# Altium footprint library th.PcbLib: 51 footprints (part 2 of 4)
Each footprint in its own frame and in the unit in brackets; x right, y up, seen from the top. Pads: shape width x height; smd on the part's side, far side on the other; paste and mask are expansions set on the pad; w line width, h text height; cw(c..) or ccw(c..) is an arc to the next point about the centre after c.
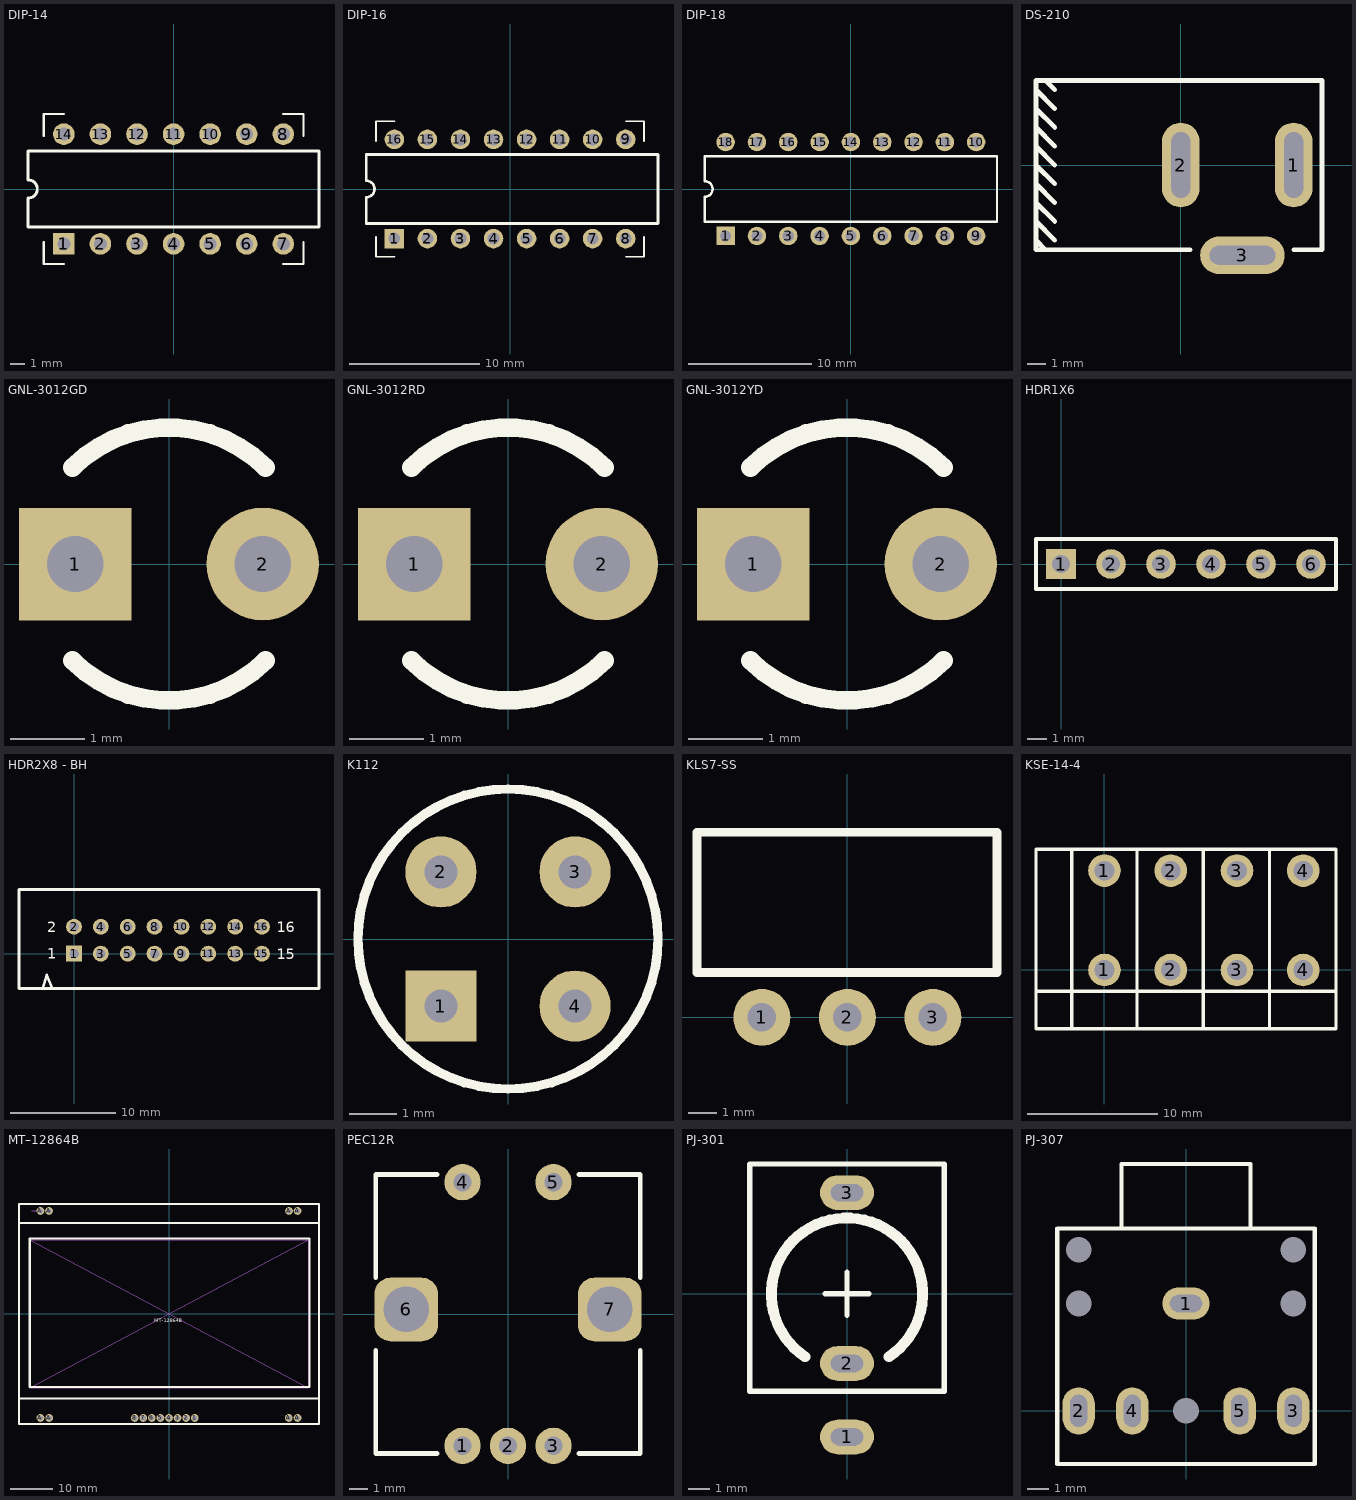
[diagram p1: the footprints below, top view; thin cyan lines are the x and y axes]

## DIP-14 [mm]
pads (14):
  rect 1.5x1.5 hole 0.9: 1(-7.62,-3.81)
  round 1.5 hole 0.9: 2(-5.08,-3.81) 3(-2.54,-3.81) 4(0,-3.81) 5(2.54,-3.81) 6(5.08,-3.81) 7(7.62,-3.81) 8(7.62,3.81) 9(5.08,3.81) 10(2.54,3.81) 11(0,3.81) 12(-2.54,3.81) 13(-5.08,3.81) 14(-7.62,3.81)
Top Overlay:
  lines w0.15: -9.017,-3.683 -9.017,-5.207 -7.62,-5.207 ; -9.017,3.683 -9.017,5.207 -7.62,5.207 ; 7.62,-5.207 9.017,-5.207 9.017,-3.683 ; 7.62,5.207 9.017,5.207 9.017,3.683
  lines w0.2: -10.1,-2.65 -10.1,-0.635 ccw(c-10.1,0) -10.1,0.635 -10.1,2.65 10.1,2.65 10.1,-2.65 -10.1,-2.65
3D body "DIP14SOC.STEP": height 5.1, standoff -2.9, extent -8.89,-5.08 8.89,5.08
3D body "SW3DPS-DIP-14-DEFAULT.STEP": height 7.51, standoff 0.53, extent -9.525,-4 9.525,4

## DIP-16 [mm]
pads (16):
  rect 1.5x1.5 hole 0.9: 1(-8.89,-3.81)
  round 1.5 hole 0.9: 2(-6.35,-3.81) 3(-3.81,-3.81) 4(-1.27,-3.81) 5(1.27,-3.81) 6(3.81,-3.81) 7(6.35,-3.81) 8(8.89,-3.81) 9(8.89,3.81) 10(6.35,3.81) 11(3.81,3.81) 12(1.27,3.81) 13(-1.27,3.81) 14(-3.81,3.81) 15(-6.35,3.81) 16(-8.89,3.81)
Top Overlay:
  lines w0.15: -10.287,-3.683 -10.287,-5.207 -8.89,-5.207 ; -10.287,3.683 -10.287,5.207 -8.89,5.207 ; 8.89,-5.207 10.287,-5.207 10.287,-3.683 ; 8.89,5.207 10.287,5.207 10.287,3.683
  lines w0.2: -11.05,2.65 -11.05,0.635 cw(c-11.05,0) -11.05,-0.635 -11.05,-2.65 11.35,-2.65 ; -11.025,2.65 11.35,2.65 ; 11.37,-2.65 11.37,2.65
3D body "SW3dPS-DIP16-300.STEP": height 8.58, standoff 1.01, extent -10,-3.935 10,3.935
3D body "User Library-16pin 0_3inch 2_54mm IC DIP Gold Socket.step": height 5.01, standoff -2.99, extent -10.16,-5 10.16,5.16

## DIP-18 [mm]
pads (18):
  rect 1.5x1.5 hole 0.9: 1(-10.16,-3.81)
  round 1.5 hole 0.9: 2(-7.62,-3.81) 3(-5.08,-3.81) 4(-2.54,-3.81) 5(0,-3.81) 6(2.54,-3.81) 7(5.08,-3.81) 8(7.62,-3.81) 9(10.16,-3.81) 10(10.16,3.81) 11(7.62,3.81) 12(5.08,3.81) 13(2.54,3.81) 14(0,3.81) 15(-2.54,3.81) 16(-5.08,3.81) 17(-7.62,3.81) 18(-10.16,3.81)
Top Overlay:
  lines w0.2: -11.85,-2.65 -11.85,-0.635 ccw(c-11.85,0) -11.85,0.635 -11.85,2.65 11.85,2.65 11.85,-2.65 -11.85,-2.65

## DS-210 [mm]
pads (3):
  oval 2x4.5 hole 3.5 slot 1 at 0 deg: 1(6,0) 2(0,0)
  oval 4.5x2 hole 3.5 slot 1 at 90 deg: 3(3.275,-4.8)
Top Overlay:
  lines w0.254: -7.7,-4 -7.2,-4.5 ; -7.7,-3 -6.7,-4 ; -7.7,-2 -6.7,-3 ; -7.7,-1 -6.7,-2 ; -7.7,0 -6.7,-1 ; -7.7,1 -6.7,0 ; -7.7,2 -6.7,1 ; -7.7,3 -6.7,2 ; -7.7,4 -6.7,3 ; -7.2,4.5 -6.7,4 ; 0.5,-4.5 -7.7,-4.5 -7.7,4.5 7.5,4.5 7.5,-4.5 6,-4.5
3D body "User Library-ds-210.STEP": height 11, standoff -4.4, extent -7.75,-5.05 6.75,4.5

## GNL-3012GD [mil]
pads (2):
  rect 60x60 hole 30: 1(-50,0)
  round 60 hole 30: 2(50,0)
Top Overlay:
  lines w10: -51.5,-51.5 ccw(c0,0) 51.5,-51.5 ; -51.5,51.5 cw(c0,0) 51.5,51.5
3D body "greengnl3.STEP": height 495.67, standoff -153.94, extent -59.84,-76.77 76.77,76.77

## GNL-3012RD [mil]
pads (2):
  rect 60x60 hole 30: 1(-50,0)
  round 60 hole 30: 2(50,0)
Top Overlay:
  lines w10: -51.5,-51.5 ccw(c0,0) 51.5,-51.5 ; -51.5,51.5 cw(c0,0) 51.5,51.5
3D body "redgnl3.STEP": height 495.67, standoff -153.94, extent -59.84,-76.77 76.77,76.77

## GNL-3012YD [mil]
pads (2):
  rect 60x60 hole 30: 1(-50,0)
  round 60 hole 30: 2(50,0)
Top Overlay:
  lines w10: -51.5,-51.5 ccw(c0,0) 51.5,-51.5 ; -51.5,51.5 cw(c0,0) 51.5,51.5
3D body "yelgnl3.STEP": height 495.67, standoff -153.94, extent -59.84,-76.77 76.77,76.77

## HDR1X6 [mm] "Connector; Header; 6 Position"
pads (6):
  rect 1.5x1.5 hole 0.9: 1(0,0)
  round 1.5 hole 0.9: 2(2.54,0) 3(5.08,0) 4(7.62,0) 5(10.16,0) 6(12.7,0)
Top Overlay:
  lines w0.2: -1.27,-1.27 13.97,-1.27 13.97,1.27 -1.27,1.27 -1.27,-1.27
3D body "pin_header_aw140-eg-g06d.stp": height 8.2, standoff -3, extent -1.17,-1.246 14.07,1.253

## HDR2X8 - BH [mm] "Connector; Header; 8x2 Position"
pads (16):
  rect 1.5x1.5 hole 0.9: 1(0,0)
  round 1.5 hole 0.9: 2(0,2.54) 3(2.54,0) 4(2.54,2.54) 5(5.08,0) 6(5.08,2.54) 7(7.62,0) 8(7.62,2.54) 9(10.16,0) 10(10.16,2.54) 11(12.7,0) 12(12.7,2.54) 13(15.24,0) 14(15.24,2.54) 15(17.78,0) 16(17.78,2.54)
Top Overlay:
  lines w0.25: -2.966,-3.297 -2.585,-2.027 -2.077,-3.297
  lines w0.254: -5.207,-3.302 -5.207,6.068 23.175,6.068 23.175,-3.302 -5.207,-3.302
  text "16" at 19.184,2.007 h1
  text "15" at 19.184,-0.533 h1
  text "1" at -2.54,-0.508 h1
  text "2" at -2.54,2.032 h1
3D body "User Library-BH-10__64.STEP": height 9.11, standoff -2.99, extent -5.11,-3.225 23.01,6.075

## K112 [mm]
pads (4):
  rect 1.5x1.5 hole 0.7: 1(-1.414,-1.414)
  round 1.5 hole 0.7: 2(-1.414,1.414) 3(1.414,1.414) 4(1.414,-1.414)
Top Overlay:
  circle w0.2: c0,0 r3.162
3D body "k-112.STEP": height 7.8, standoff -1.75, extent -2.638,-2.647 3.602,2.647

## KLS7-SS [mm]
pads (3):
  round 2 hole 1: 1(-3,0) 2(0,0) 3(3,0)
Top Overlay:
  lines w0.3: -5.275,1.575 -5.275,6.5 5.25,6.5 5.25,1.575 -5.275,1.575
3D body "L-KLS7_SS.STEP": height 5.55, standoff -3.7, extent -5.25,-0.325 5.25,9.925

## KSE-14-4 [mm]
pads (8):
  round 2.5 hole 1.5: 1(0,0) 1(0,7.62) 2(5.08,0) 2(5.08,7.62) 3(10.16,0) 3(10.16,7.62) 4(15.24,0) 4(15.24,7.62)
Top Overlay:
  lines w0.25: -5.25,-1.63 17.75,-1.63 ; -2.5,-4.5 -2.5,9.25 ; 2.5,-4.5 2.5,9.25 ; 7.58,-4.5 7.58,9.25 ; 12.66,-4.5 12.66,9.25 ; -5.25,-4.5 17.75,-4.5 17.75,9.25 -5.25,9.25 -5.25,-4.5
3D body "KSE14.STEP": height 14.2, standoff -3.8, extent -5.205,-4.325 17.655,9.075

## MT–12864B [mm]
pads (16):
  round 1.8 hole 1.2: 1(6,-24.3) 2(4,-24.3) 3(2,-24.3) 4(0,-24.3) 5(-2,-24.3) 6(-4,-24.3) 7(-6,-24.3) 8(-8,-24.3) A(-30,24) A(-30,-24.3) A(-28,24) A(-27.956,-24.3) A(27.96,-24.3) A(28,24) A(30,-24.3) A(30,24)
Top Overlay:
  lines w0.254: -35,-19.768 -35,20.6 ; 35,-20.8 35,-19.768
  lines w0.4: -35,-19.768 35,-19.768 ; -35,-25.7 -35,25.6 35,25.6 35,-20.8 35,-25.7 -35,-25.7
  lines w0.5: -34.8,21.2 34.8,21.2 ; -32.5,-17.05 32.754,-17.05 32.754,17.576 -32.5,17.576 -32.5,-17.05
  text "MT-12864B" at -3.5,-2.3 h1.52
Mechanical 15:
  lines w0.254: -30,25 -30,24 ; -32.5,-17.3 -32.5,17.3 ; -32.5,-17.3 32.5,-17.3 ; -32.5,-17.3 32.5,17.3 ; -32.5,17.3 32.5,17.3 ; -32.5,17.3 32.5,-17.3 ; -30,24 -32,24 -30,24 ; 32.5,-17.3 32.5,17.3
3D body: height 7, standoff -3, extent -30.496,23.502 -29.5,24.5
3D body: height 7, standoff -3, extent 29.504,23.502 30.5,24.5
3D body: height 7, standoff -3, extent 29.504,-24.799 30.5,-23.801
3D body: height 7, standoff -3, extent 27.5,-24.8 28.496,-23.802
3D body: height 7, standoff -3, extent -30.496,-24.799 -29.5,-23.801
3D body: height 7, standoff -3, extent -28.496,-24.8 -27.5,-23.802
3D body: height 7, standoff -3, extent -28.496,23.502 -27.5,24.5
3D body: height 7, standoff -3, extent 27.504,23.502 28.5,24.5
3D body: height 7, standoff -3, extent -8.496,-24.8 -7.5,-23.802
3D body: height 7, standoff -3, extent -6.496,-24.8 -5.5,-23.802
3D body: height 7, standoff -3, extent -4.496,-24.8 -3.5,-23.802
3D body: height 7, standoff -3, extent -2.496,-24.8 -1.5,-23.802
3D body: height 7, standoff -3, extent -0.496,-24.8 0.5,-23.802
3D body: height 7, standoff -3, extent 1.504,-24.8 2.5,-23.802
3D body: height 7, standoff -3, extent 3.504,-24.8 4.5,-23.802
3D body: height 7, standoff -3, extent 5.504,-24.8 6.5,-23.802
3D body: height 4, standoff 3.3, extent -35,-24.2 35,23.8
3D body: height 4.7, standoff 4, extent -35,-19.225 35,19.275
3D body: height 5.4, standoff 4.7, extent -31.975,-16.3 32.025,16.2

## PEC12R [mm]
pads (7):
  round 2 hole 1: 1(-2.5,-7.25) 2(0,-7.25) 3(2.5,-7.25) 4(-2.5,7.25) 5(2.5,7.25)
  rrect50% 3.5x3.5 hole 2.5: 6(-5.6,0.25) 7(5.6,0.25)
Top Overlay:
  lines w0.254: -7.275,-2 -7.275,-7.675 -3.9,-7.675 ; -7.275,2 -7.275,7.675 -3.9,7.675 ; 3.9,-7.675 7.275,-7.675 7.275,-2 ; 3.9,7.675 7.275,7.675 7.275,2
3D body "69072.stp": height 17.4, standoff -3.6, extent -7.05,-7.375 6.95,7.375

## PJ-301 [mm]
pads (3):
  oval 2.5x1.6 hole 0.8 slot 1.5 at 0 deg: 1(0,-6.625) 2(0,-3.225) 3(0,4.675)
Top Overlay:
  lines w0.25: -1,0 1,0 ; 0,-1 0,1
  lines w0.254: -4.5,-4.5 -4.5,6 4.5,6 4.5,-4.5 -4.5,-4.5
  lines w0.5: -1.941,-2.912 cw(c0,0) 1.941,-2.912
3D body "PJ-301.STEP": height 15.7, standoff -5.13, extent -4.5,-6.725 4.5,6

## PJ-307 [mm]
pads (10):
  round 0 hole 1.2: 0(-5,5) 0(-5,7.5) 0(0,0) 0(5,5) 0(5,7.5)
  oval 2.2x1.5 hole 0.8 slot 1.5 at 0 deg: 1(0,5)
  oval 1.5x2.2 hole 0.8 slot 1.5 at 90 deg: 2(-5,0) 3(5,0) 4(-2.5,0) 5(2.5,0)
Top Overlay:
  lines w0.2: -3,8.5 -3,11.5 3,11.5 3,8.5 ; -6,-2.475 6,-2.475 6,8.5 -6,8.5 -6,-2.475
3D body "Pj307.STEP": height 5.95, standoff -2.6, extent -6,-2.45 6,11.55